# Altium footprint library Active.PcbLib: 325 footprints (part 3 of 23)
Each footprint in its own frame and in the unit in brackets; x right, y up, seen from the top. Pads: shape width x height; smd on the part's side, far side on the other; paste and mask are expansions set on the pad; w line width, h text height; cw(c..) or ccw(c..) is an arc to the next point about the centre after c.
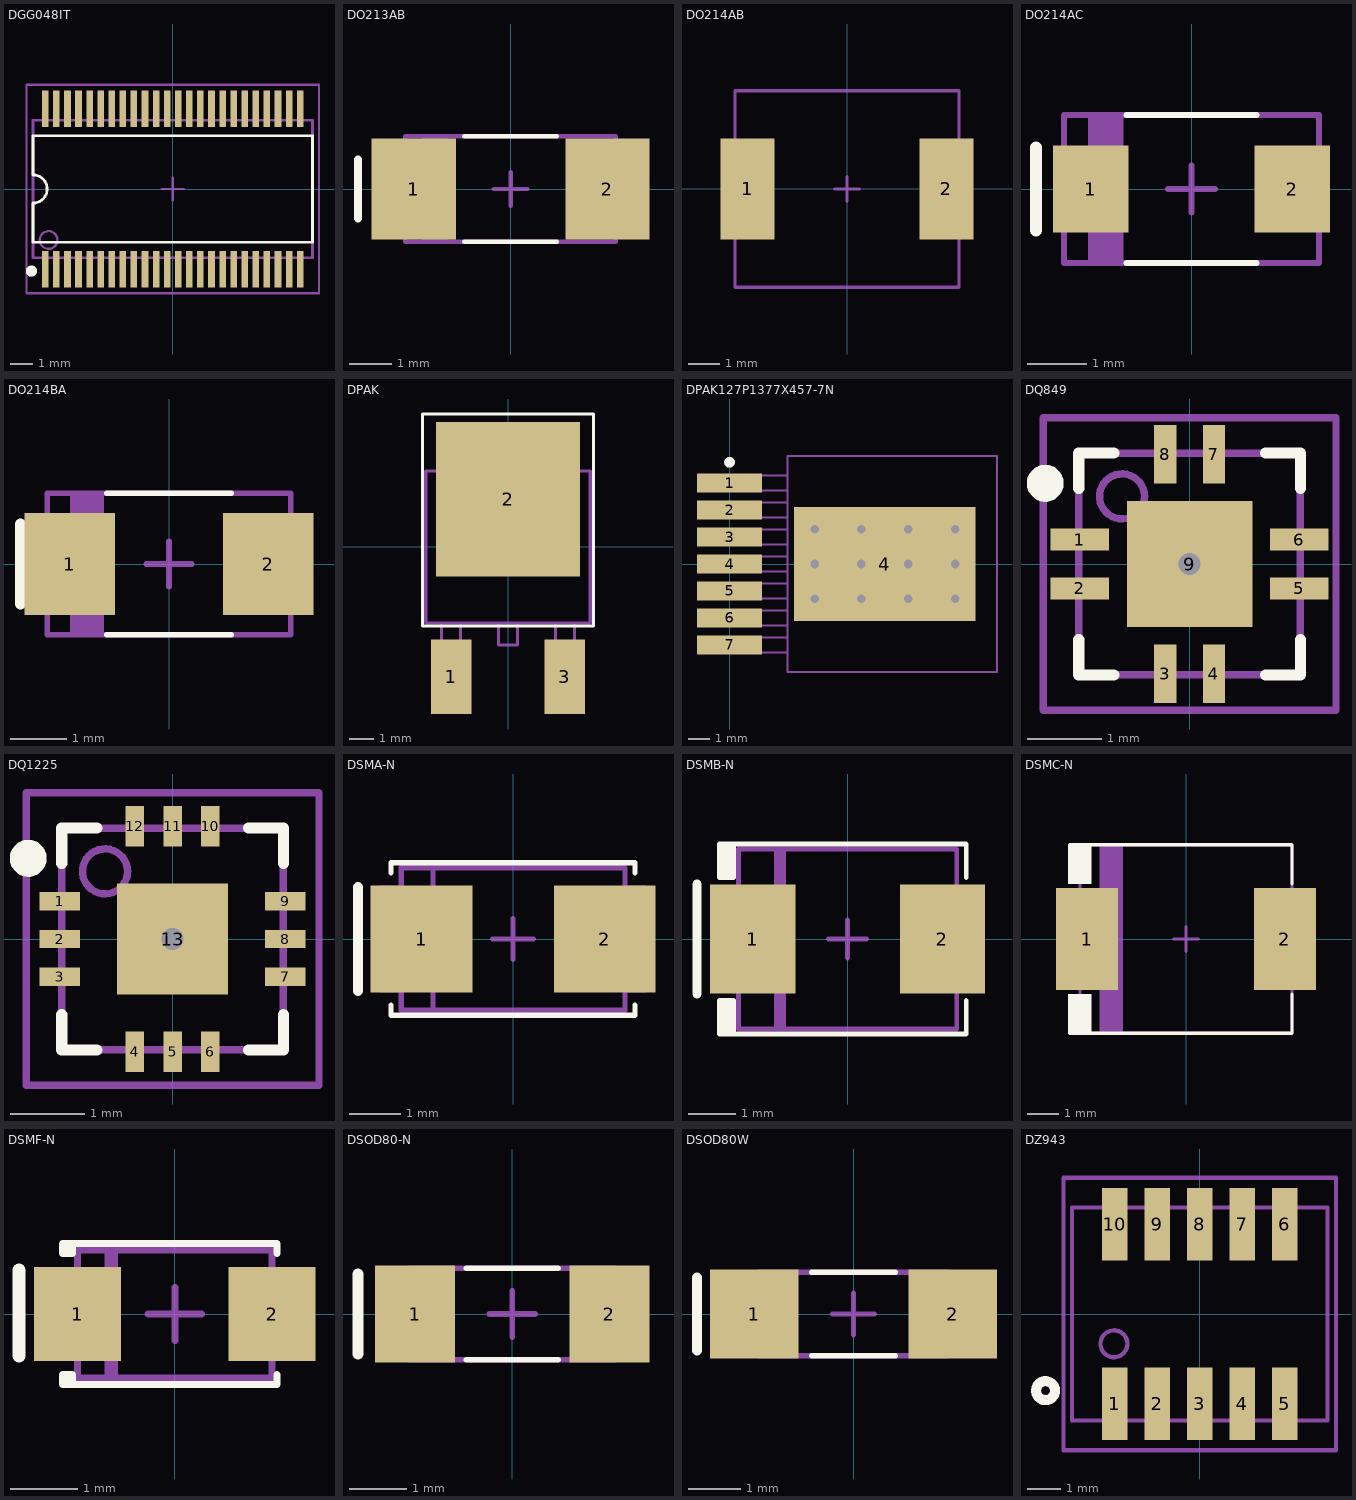
[diagram p2: the footprints below, top view; thin cyan lines are the x and y axes]

## DGG048IT [mm] "Shrink Small Outline; 48 Leads; Body Width 6.1 mm; Pitch 0.5 mm"
height 1.2
pads (48):
  rect 0.3x1.65 smd mask+0.051: 1(-5.75,-3.625) 2(-5.25,-3.625) 3(-4.75,-3.625) 4(-4.25,-3.625) 5(-3.75,-3.625) 6(-3.25,-3.625) 7(-2.75,-3.625) 8(-2.25,-3.625) 9(-1.75,-3.625) 10(-1.25,-3.625) 11(-0.75,-3.625) 12(-0.25,-3.625) 13(0.25,-3.625) 14(0.75,-3.625) 15(1.25,-3.625) 16(1.75,-3.625) 17(2.25,-3.625) 18(2.75,-3.625) 19(3.25,-3.625) 20(3.75,-3.625) 21(4.25,-3.625) 22(4.75,-3.625) 23(5.25,-3.625) 24(5.75,-3.625) 25(5.75,3.625) 26(5.25,3.625) 27(4.75,3.625) 28(4.25,3.625) 29(3.75,3.625) 30(3.25,3.625) 31(2.75,3.625) 32(2.25,3.625) 33(1.75,3.625) 34(1.25,3.625) 35(0.75,3.625) 36(0.25,3.625) 37(-0.25,3.625) 38(-0.75,3.625) 39(-1.25,3.625) 40(-1.75,3.625) 41(-2.25,3.625) 42(-2.75,3.625) 43(-3.25,3.625) 44(-3.75,3.625) 45(-4.25,3.625) 46(-4.75,3.625) 47(-5.25,3.625) 48(-5.75,3.625)
Top Overlay:
  circle w0.25: c-6.375,-3.7 r0.125
  lines w0.127: -6.3,-2.4 -6.3,-0.635 ccw(c-6.3,0) -6.3,0.635 -6.3,2.4 6.3,2.4 6.3,-2.4 -6.3,-2.4
Mechanical 13:
  circle w0.1: c-5.6,-2.3 r0.4
  lines w0.127: -6.3,-3.1 6.3,-3.1 6.3,3.1 -6.3,3.1 -6.3,-3.1
Mechanical 15:
  lines w0.1: -0.508,0 0.508,0 ; 0,-0.508 0,0.508 ; -6.6,-4.7 -6.6,4.7 6.6,4.7 6.6,-4.7 -6.6,-4.7
3D body: height 1.2, standoff 0.13, extent -6.3,-3.1 6.3,3.1

## DO213AB [mm] "Diode MELF DO213AB"
height 2.5
pads (2):
  rect 2x2.4 smd: 1(-2.3,0) 2(2.3,0)
Top Overlay:
  lines w0.102: -1.1,-1.25 1.1,-1.25 ; -1.1,1.25 1.1,1.25
  lines w0.2: -3.625,-0.7 -3.625,0.7
Mechanical 13:
  lines w0.102: -2.05,-1.25 -2.05,1.25 ; -1.95,-1.25 -1.95,1.25 ; -1.85,-1.25 -1.85,1.25 ; -1.75,-1.25 -1.75,1.25 ; -1.65,-1.25 -1.65,1.25 ; -1.55,-1.25 -1.55,1.25 ; -2.5,-1.25 -2.5,-0.7 -2.5,1.25 2.5,1.25 2.5,-1.25 -2.5,-1.25
Mechanical 15:
  lines w0.102: -0.4,0 0.4,0 ; 0,-0.4 0,0.4
3D body: height 1.6, standoff 0, extent -2.5,-1.25 2.5,1.25

## DO214AB [mm] "Diode SMA DO214AB"
height 5.436
pads (2):
  rect 1.7x3.2 smd paste+0 mask+0.051: 1(-3.15,0) 2(3.15,0)
Mechanical 13:
  lines w0.102: -3.55,-3.11 -3.55,3.11 3.55,3.11 3.55,-3.11 -3.55,-3.11
Mechanical 15:
  lines w0.102: -0.4,0 0.4,0 ; 0,-0.4 0,0.4
3D body: height 2.6, standoff 0, extent -3.55,-3.11 3.55,3.11
3D body: height 2.6, standoff 2.6, extent -3,-3.11 -2.1,3.1

## DO214AC [mil] "Diode SMA DO214AC"
height 86.61
pads (2):
  rect 50x58 smd paste+0 mask+2: 1(-67,0) 2(67,0)
Top Overlay:
  lines w4.02: -43.31,-49.21 43.31,-49.21 ; -43.31,49.21 43.31,49.21
  lines w7.87: -103.35,-27.56 -103.35,27.56
Mechanical 13:
  lines w4.02: -66.93,-49.21 -66.93,49.21 ; -62.99,-49.21 -62.99,49.21 ; -59.06,-49.21 -59.06,49.21 ; -55.12,-49.21 -55.12,49.21 ; -51.18,-49.21 -51.18,49.21 ; -47.24,-49.21 -47.24,49.21 ; -84.65,-49.21 84.65,-49.21 84.65,49.21 -84.65,49.21 -84.65,-27.56 -84.65,-49.21
Mechanical 15:
  lines w4.02: -15.75,0 15.75,0 ; 0,-15.75 0,15.75
3D body: height 86.61, standoff 0, extent -84.65,-49.21 84.65,49.21
3D body: height 87.01, standoff 86.61, extent -68.9,-49.21 -45.28,49.21

## DO214BA [mm] "Diode SMA DO214BA"
height 3
pads (2):
  rect 1.6x1.8 smd paste+0 mask+0.051: 1(-1.75,0) 2(1.75,0)
Top Overlay:
  lines w0.102: -1.1,-1.25 1.1,-1.25 ; -1.1,1.25 1.1,1.25
  lines w0.2: -2.625,-0.7 -2.625,0.7
Mechanical 13:
  lines w0.102: -1.7,-1.25 -1.7,1.25 ; -1.6,-1.25 -1.6,1.25 ; -1.5,-1.25 -1.5,1.25 ; -1.4,-1.25 -1.4,1.25 ; -1.3,-1.25 -1.3,1.25 ; -1.2,-1.25 -1.2,1.25 ; -2.15,-1.25 2.15,-1.25 2.15,1.25 -2.15,1.25 -2.15,-0.7 -2.15,-1.25
Mechanical 15:
  lines w0.102: -0.4,0 0.4,0 ; 0,-0.4 0,0.4
3D body: height 2.75, standoff 0, extent -2.15,-1.25 2.15,1.25
3D body: height 2.76, standoff 2.75, extent -1.75,-1.25 -1.15,1.25

## DPAK [mil]
height 137.79
pads (3):
  rect 64x118 smd: 1(-90,-205) 3(90,-205)
  rect 228x244 smd paste-200: 2(0,75)
Top Overlay:
  lines w5: -135,-125 -135,210 135,210 135,-125 -135,-125
Top Paste:
  rectangle: -100,95 -10,190
  rectangle: 10,95 100,190
  rectangle: 10,-30 100,80
  rectangle: -100,-30 -10,80
Mechanical 13:
  lines w5: -105,-120 -105,-147.5 -105,-165 -110,-170 -110,-197.5 -105,-202.5 -105,-230 -75,-230 -75,-202.5 -70,-197.5 -70,-170 -75,-165 -75,-120 ; -100,120 -100,130 -100,150 -80,170 80,170 100,150 100,120 ; -15,-120 -15,-155 15,-155 15,-120 ; 75,-120 75,-147.5 75,-165 70,-170 70,-197.5 75,-202.5 75,-230 105,-230 105,-202.5 110,-197.5 110,-170 105,-165 105,-120 ; -130,-120 -130,120 130,120 130,-120 -130,-120
Mechanical 15:
  lines w5: -25,0 25,0 ; 0,-25 0,25
3D body: height 39.37, standoff 31.5, extent -13.78,-155.51 13.78,-120.08
3D body: height 7.87, standoff 0, extent 75.79,-230.31 103.35,-165.35
3D body: height 39.37, standoff 0, extent 75.79,-165.35 103.35,-157.48
3D body: height 39.37, standoff 31.5, extent 75.79,-165.35 103.35,-120.08
3D body: height 39.37, standoff 31.5, extent -103.35,-165.35 -75.79,-120.08
3D body: height 39.37, standoff 0, extent -103.35,-165.35 -75.79,-157.48
3D body: height 7.87, standoff 0, extent -103.35,-230.31 -75.79,-165.35
3D body: height 90, standoff 0, extent -130,-120 130,120
3D body: height 20, standoff 0, extent -100,120 100,170

## DPAK127P1377X457-7N [mm] "D2-PAK, 7-Pads, Body 8.15x8.56mm (max), IPC Medium Density"
height 4.57
pads (8):
  rect 3.06x0.89 smd: 1(0,3.81) 2(0,2.54) 3(0,1.27) 4(0,0) 5(0,-1.27) 6(0,-2.54) 7(0,-3.81)
  rect 8.54x5.35 smd paste-10 mask-10: 4(7.305,0)
via 8.41,0 diameter 0.8 hole 0.4
via 8.41,1.625 diameter 0.8 hole 0.4
via 8.41,-1.625 diameter 0.8 hole 0.4
via 4,0 diameter 0.8 hole 0.4
via 10.61,0 diameter 0.8 hole 0.4
via 6.2,-1.625 diameter 0.8 hole 0.4
via 6.2,1.625 diameter 0.8 hole 0.4
via 6.2,0 diameter 0.8 hole 0.4
via 10.61,1.625 diameter 0.8 hole 0.4
via 10.61,-1.625 diameter 0.8 hole 0.4
via 4,-1.625 diameter 0.8 hole 0.4
via 4,1.625 diameter 0.8 hole 0.4
Top Overlay:
  circle w0.25: c0,4.785 r0.125
Top Paste:
  drawing of 26 lines, arcs and shapes, not listed
Top Solder:
  drawing of 24 lines, arcs and shapes, not listed
Mechanical 13:
  lines w0.1: 2.735,-4.16 -1.185,-4.16 -1.185,-3.46 2.735,-3.46 ; 2.735,-2.89 -1.185,-2.89 -1.185,-2.19 2.735,-2.19 ; 2.735,-1.62 -1.185,-1.62 -1.185,-0.92 2.735,-0.92 ; 2.735,-0.35 -1.185,-0.35 -1.185,0.35 2.735,0.35 ; 2.735,0.92 -1.185,0.92 -1.185,1.62 2.735,1.62 ; 2.735,2.19 -1.185,2.19 -1.185,2.89 2.735,2.89 ; 2.735,3.46 -1.185,3.46 -1.185,4.16 2.735,4.16 ; 2.735,-5.08 2.735,5.08 12.585,5.08 12.585,-5.08 2.735,-5.08
Mechanical 15:
  lines w0.1: 5.5,0.635 6.5,0.635 ; 6,0.135 6,1.135
3D body: height 4.57, standoff 0, extent 2.735,-5.08 12.585,5.08
3D body: height 1, standoff 0, extent -1.185,-4.16 2.735,-3.46
3D body: height 1, standoff 0, extent -1.185,-2.89 2.735,-2.19
3D body: height 1, standoff 0, extent -1.185,-1.62 2.735,-0.92
3D body: height 1, standoff 0, extent -1.185,-0.35 2.735,0.35
3D body: height 1, standoff 0, extent -1.185,0.92 2.735,1.62
3D body: height 1, standoff 0, extent -1.185,2.19 2.735,2.89
3D body: height 1, standoff 0, extent -1.185,3.46 2.735,4.16

## DQ849 [mm] "QFN, 12-Leads, Body 3,0x3,0mm (max), Pitch 0,66mm, IPC Medium Density"
height 0.89
pads (9):
  rect 0.79x0.3 smd mask+0.025: 1(-1.485,0.33) 2(-1.485,-0.33) 5(1.485,-0.33) 6(1.485,0.33)
  rect 0.3x0.79 smd mask+0.025: 3(-0.33,-1.485) 4(0.33,-1.485) 7(0.33,1.485) 8(-0.33,1.485)
  rect 1.7x1.7 smd paste-5 mask-5: 9(0,0)
via 0,0 diameter 0.65 hole 0.3
Top Overlay:
  circle w0.25: c-1.954,1.092 r0.125
  lines w0.15: -1.5,-1.025 -1.5,-1.5 -1.025,-1.5 ; -1.5,1.025 -1.5,1.5 -1.025,1.5 ; 1.025,-1.5 1.5,-1.5 1.5,-1.025 ; 1.025,1.5 1.5,1.5 1.5,1.025
Top Paste:
  region: -0.75,-0.15 -0.3,-0.15 -0.15,-0.3 0.15,-0.3 0.3,-0.15 0.75,-0.15 0.75,-0.75 -0.75,-0.75
  region: -0.75,0.15 -0.3,0.15 -0.15,0.3 0.15,0.3 0.3,0.15 0.75,0.15 0.75,0.75 -0.75,0.75
Top Solder:
  region: -0.8,0.8 0,0.8 0,0.325 -0.032,0.325 -0.127,0.306 -0.234,0.234 -0.306,0.127 -0.325,0.032 -0.325,0 -0.325,-0.032 -0.306,-0.127 -0.234,-0.234 -0.127,-0.306 -0.032,-0.325 0,-0.325 0.032,-0.325 0.127,-0.306 0.234,-0.234 0.306,-0.127 0.325,-0.032 0.325,0 0.325,0.032 0.306,0.127 0.234,0.234 0.127,0.306 0.032,0.325 0,0.325 0,0.8 0.8,0.8 0.8,-0.8 -0.8,-0.8
Mechanical 13:
  circle w0.1: c-0.914,0.914 r0.305
  lines w0.1: -1.5,-1.5 1.5,-1.5 1.5,1.5 -1.5,1.5 -1.5,-1.5
Mechanical 15:
  lines w0.1: -0.5,0 0.5,0 ; 0,-0.5 0,0.5 ; -1.981,-1.981 1.981,-1.981 1.981,1.981 -1.981,1.981 -1.981,-1.981
3D body: height 0.89, standoff 0.01, extent -1.5,-1.5 1.5,1.5
3D body: height 0.9, standoff 0.89, extent -1.219,0.61 -0.622,1.208

## DQ1225 [mm] "QFN, 12-Leads, Body 3,0x3,0mm (max), Pitch 0,51mm, IPC Medium Density"
height 0.89
pads (13):
  rect 0.55x0.25 smd mask+0.025: 1(-1.525,0.51) 2(-1.525,0) 3(-1.525,-0.51) 7(1.525,-0.51) 8(1.525,0) 9(1.525,0.51)
  rect 0.25x0.55 smd mask+0.025: 4(-0.51,-1.525) 5(0,-1.525) 6(0.51,-1.525) 10(0.51,1.525) 11(0,1.525) 12(-0.51,1.525)
  rect 1.5x1.5 smd paste-5 mask-5: 13(0,0)
via 0,0 diameter 0.65 hole 0.3
Top Overlay:
  circle w0.25: c-1.954,1.092 r0.125
  lines w0.15: -1.5,-1.025 -1.5,-1.5 -1.025,-1.5 ; -1.5,1.025 -1.5,1.5 -1.025,1.5 ; 1.025,-1.5 1.5,-1.5 1.5,-1.025 ; 1.025,1.5 1.5,1.5 1.5,1.025
Top Paste:
  region: -0.75,-0.15 -0.3,-0.15 -0.15,-0.3 0.15,-0.3 0.3,-0.15 0.75,-0.15 0.75,-0.75 -0.75,-0.75
  region: -0.75,0.15 -0.3,0.15 -0.15,0.3 0.15,0.3 0.3,0.15 0.75,0.15 0.75,0.75 -0.75,0.75
Top Solder:
  region: -0.8,0.8 0,0.8 0,0.325 -0.032,0.325 -0.127,0.306 -0.234,0.234 -0.306,0.127 -0.325,0.032 -0.325,0 -0.325,-0.032 -0.306,-0.127 -0.234,-0.234 -0.127,-0.306 -0.032,-0.325 0,-0.325 0.032,-0.325 0.127,-0.306 0.234,-0.234 0.306,-0.127 0.325,-0.032 0.325,0 0.325,0.032 0.306,0.127 0.234,0.234 0.127,0.306 0.032,0.325 0,0.325 0,0.8 0.8,0.8 0.8,-0.8 -0.8,-0.8
Mechanical 13:
  circle w0.1: c-0.914,0.914 r0.305
  lines w0.1: -1.5,-1.5 1.5,-1.5 1.5,1.5 -1.5,1.5 -1.5,-1.5
Mechanical 15:
  lines w0.1: -0.5,0 0.5,0 ; 0,-0.5 0,0.5 ; -1.981,-1.981 1.981,-1.981 1.981,1.981 -1.981,1.981 -1.981,-1.981
3D body: height 0.89, standoff 0.01, extent -1.5,-1.5 1.5,1.5
3D body: height 0.9, standoff 0.89, extent -1.219,0.61 -0.622,1.208

## DSMA-N [mm] "DIODE SMA normal"
height 2.3
pads (2):
  rect 2x2.1 smd: 1(-1.8,0) 2(1.8,0)
Top Overlay:
  lines w0.102: -2.4,-1.3 -2.4,-1.5 2.4,-1.5 2.4,-1.3 ; -2.4,1.3 -2.4,1.5 2.4,1.5 2.4,1.3
  lines w0.2: -3.05,-1.025 -3.05,1.025
Mechanical 13:
  lines w0.102: -2.2,-1 -2.6,-1 -2.6,1 -2.2,1 ; -1.575,-1.4 -1.575,1.4 ; 2.2,-1 2.6,-1 2.6,1 2.2,1 ; -2.2,-1.4 2.2,-1.4 2.2,1.4 -2.2,1.4 -2.2,-1.4
Mechanical 15:
  lines w0.102: -0.4,0 0.4,0 ; 0,-0.4 0,0.4
3D body: height 2.4, standoff 0, extent -2.2,-1.4 2.2,1.4
3D body: height 2.41, standoff 2.4, extent -1.95,-1.4 -1.425,1.4
3D body: height 1.4, standoff 0, extent -2.6,-1 -2.2,1
3D body: height 1.4, standoff 0, extent 2.2,-1 2.6,1

## DSMB-N [mm] "DIODE SMB normal"
height 2.4
pads (2):
  rect 1.8x2.3 smd: 1(-2,0) 2(2,0)
Top Overlay:
  lines w0.102: -2.5,-1.3 -2.5,-2 ; -2.5,1.3 -2.5,2 ; -2.4,-2 -2.4,-1.3 -2.6,-1.3 ; -2.4,2 -2.4,1.3 -2.6,1.3 ; 2.5,-1.3 2.5,-2 -2.5,-2 ; 2.5,1.3 2.5,2 -2.5,2 ; -2.6,-2 -2.7,-2 -2.7,-1.3 -2.6,-1.3 ; -2.6,-2 -2.5,-2 ; -2.6,-2 -2.6,-1.3 ; -2.6,1.3 -2.7,1.3 -2.7,2 -2.6,2 ; -2.6,1.3 -2.6,2 ; -2.6,2 -2.5,2
  lines w0.2: -3.175,-1.15 -3.175,1.15
Mechanical 13:
  lines w0.102: -2.3,-1 -2.6,-1 -2.6,1 -2.3,1 ; -1.5,-1.9 -1.5,1.9 ; -1.425,-1.9 -1.425,1.9 ; -1.35,-1.9 -1.35,1.9 ; 2.3,-1 2.6,-1 2.6,1 2.3,1 ; -2.3,-1.9 -2.3,1.9 2.3,1.9 2.3,-1.9 -2.3,-1.9
Mechanical 15:
  lines w0.102: -0.4,0 0.4,0 ; 0,-0.4 0,0.4
3D body: height 2.41, standoff 2.4, extent -1.725,-1.9 -1.3,1.9
3D body: height 1.4, standoff 0, extent 2.3,-1 2.6,1
3D body: height 1.4, standoff 0, extent -2.6,-1 -2.3,1
3D body: height 2.4, standoff 0, extent -2.3,-1.9 2.3,1.9

## DSMC-N [mm] "DIODE SMC normal DO-214AB"
height 2.6
pads (2):
  rect 2x3.3 smd: 1(-3.2,0) 2(3.2,0)
Top Overlay:
  rectangle: -3.81,1.778 -3.048,3.048
  rectangle: -3.81,-3.048 -3.048,-1.778
  lines w0.102: -3.759,-3.048 3.429,-3.048 3.429,-1.778 ; -3.759,3.048 3.429,3.048 3.429,1.778
Mechanical 13:
  rectangle: -2.794,-3.048 -2.032,3.048
  lines w0.102: -3.429,-1.524 -3.937,-1.524 -3.937,1.524 -3.429,1.524 ; 3.429,-1.524 3.937,-1.524 3.937,1.524 3.429,1.524 ; -3.429,-3.048 -3.429,3.048 3.429,3.048 3.429,-3.048 -3.429,-3.048
Mechanical 15:
  lines w0.102: -0.4,0 0.4,0 ; 0,-0.4 0,0.4
3D body: height 2.61, standoff 2.6, extent -2.794,-3.048 -2.032,3.048
3D body: height 1.35, standoff 0, extent 3.429,-1.524 3.937,1.524
3D body: height 1.35, standoff 0, extent -3.937,-1.524 -3.429,1.524
3D body: height 2.6, standoff 0.1, extent -3.429,-3.048 3.429,3.048

## DSMF-N [mm] "Diode SMF"
height 1
pads (2):
  rect 1.3x1.4 smd: 1(-1.45,0) 2(1.45,0)
Top Overlay:
  lines w0.102: 1.525,-0.9 1.525,-1.05 -1.525,-1.05 ; 1.525,0.9 1.525,1.05 -1.525,1.05 ; -1.675,-0.9 -1.525,-0.9 -1.525,-1.05 ; -1.675,-0.9 -1.675,-1.05 -1.525,-1.05 ; -1.675,-0.9 -1.525,-1.05 ; -1.675,0.9 -1.525,1.05 ; -1.675,0.9 -1.675,1.05 -1.525,1.05 ; -1.675,0.9 -1.525,0.9 -1.525,1.05
  lines w0.2: -2.325,-0.625 -2.325,0.65
Mechanical 13:
  lines w0.102: -1,-0.95 -1,0.95 ; -0.9,-0.95 -0.9,0.95 ; -1.45,-0.95 1.45,-0.95 1.45,0.95 -1.45,0.95 -1.45,-0.95
Mechanical 15:
  lines w0.102: -0.4,0 0.4,0 ; 0,-0.4 0,0.4
3D body: height 1.01, standoff 1, extent -1.225,-0.95 -0.85,0.95
3D body: height 1, standoff 0, extent -1.45,-0.95 1.45,0.95

## DSOD80-N [mm] "Diode SOD80"
height 1.6
pads (2):
  rect 1.4x1.7 smd: 1(-1.7,0) 2(1.7,0)
Top Overlay:
  lines w0.102: -0.8,-0.8 0.8,-0.8 ; -0.8,0.8 0.8,0.8
  lines w0.2: -2.7,-0.7 -2.7,0.7
Mechanical 13:
  lines w0.102: -1.475,0.8 -1.475,-0.8 -1.375,-0.8 -1.375,0.8 -1.275,0.8 -1.275,-0.8 -1.175,-0.8 -1.175,0.8 ; -1.8,-0.8 -1.8,0 -1.8,0.8 1.8,0.8 1.8,-0.8 -1.8,-0.8
Mechanical 15:
  lines w0.102: -0.4,0 0.4,0 ; 0,-0.4 0,0.4
3D body: height 1.7, standoff 0.1, extent -1.4,-0.797 1.4,0.797
3D body: height 1.7, standoff 0.1, extent -1.8,-0.797 -1.4,0.797
3D body: height 1.7, standoff 0.1, extent 1.4,-0.797 1.8,0.797
3D body: height 1.73, standoff 0.07, extent -1.2,-0.827 -0.6,0.827

## DSOD80W [mm] "Diode SOD80 wavw solder"
height 1.6
pads (2):
  rect 1.7x1.7 smd: 1(-1.9,0) 2(1.9,0)
Top Overlay:
  lines w0.102: -0.8,-0.8 0.8,-0.8 ; -0.8,0.8 0.8,0.8
  lines w0.2: -3,-0.7 -3,0.7
Mechanical 13:
  lines w0.102: -1.475,0.8 -1.475,-0.8 -1.375,-0.8 -1.375,0.8 -1.275,0.8 -1.275,-0.8 -1.175,-0.8 -1.175,0.8 ; -1.8,-0.8 -1.8,0 -1.8,0.8 1.8,0.8 1.8,-0.8 -1.8,-0.8
Mechanical 15:
  lines w0.102: -0.4,0 0.4,0 ; 0,-0.4 0,0.4
3D body: height 1.7, standoff 0.1, extent -1.4,-0.797 1.4,0.797
3D body: height 1.7, standoff 0.1, extent -1.8,-0.797 -1.4,0.797
3D body: height 1.7, standoff 0.1, extent 1.4,-0.797 1.8,0.797
3D body: height 1.73, standoff 0.07, extent -1.2,-0.827 -0.6,0.827

## DZ943 [mm] "DZ943 10pin RF module"
height 4.83
pads (10):
  rect 0.76x2.16 smd: 1(-2.54,-2.68) 2(-1.27,-2.68) 3(0,-2.68) 4(1.27,-2.68) 5(2.54,-2.68) 6(2.54,2.68) 7(1.27,2.68) 8(0,2.68) 9(-1.27,2.68)
  rect 0.76x2.16 smd mask+0.102: 10(-2.54,2.68)
Top Overlay:
  circle w0.3: c-4.602,-2.286 r0.284
Mechanical 13:
  circle w0.127: c-2.561,-0.889 r0.402
  lines w0.127: -3.81,-3.175 -3.81,3.175 3.81,3.175 3.81,-3.175 -3.81,-3.175
Mechanical 15:
  lines w0.127: -4.064,-4.064 -4.064,4.064 4.064,4.064 4.064,-4.064 -4.064,-4.064
3D body: height 0.83, standoff 0, extent -3.81,-3.175 3.81,3.175
3D body: height 4.83, standoff 0.83, extent -3.302,-2.667 3.302,2.667
3D body: height 4.84, standoff 4.8, extent -3.138,-2.214 -1.942,-1.016